# Altium footprint library Power_PCB.PcbLib: 52 footprints (part 3 of 4)
Each footprint in its own frame and in the unit in brackets; x right, y up, seen from the top. Pads: shape width x height; smd on the part's side, far side on the other; paste and mask are expansions set on the pad; w line width, h text height; cw(c..) or ccw(c..) is an arc to the next point about the centre after c.
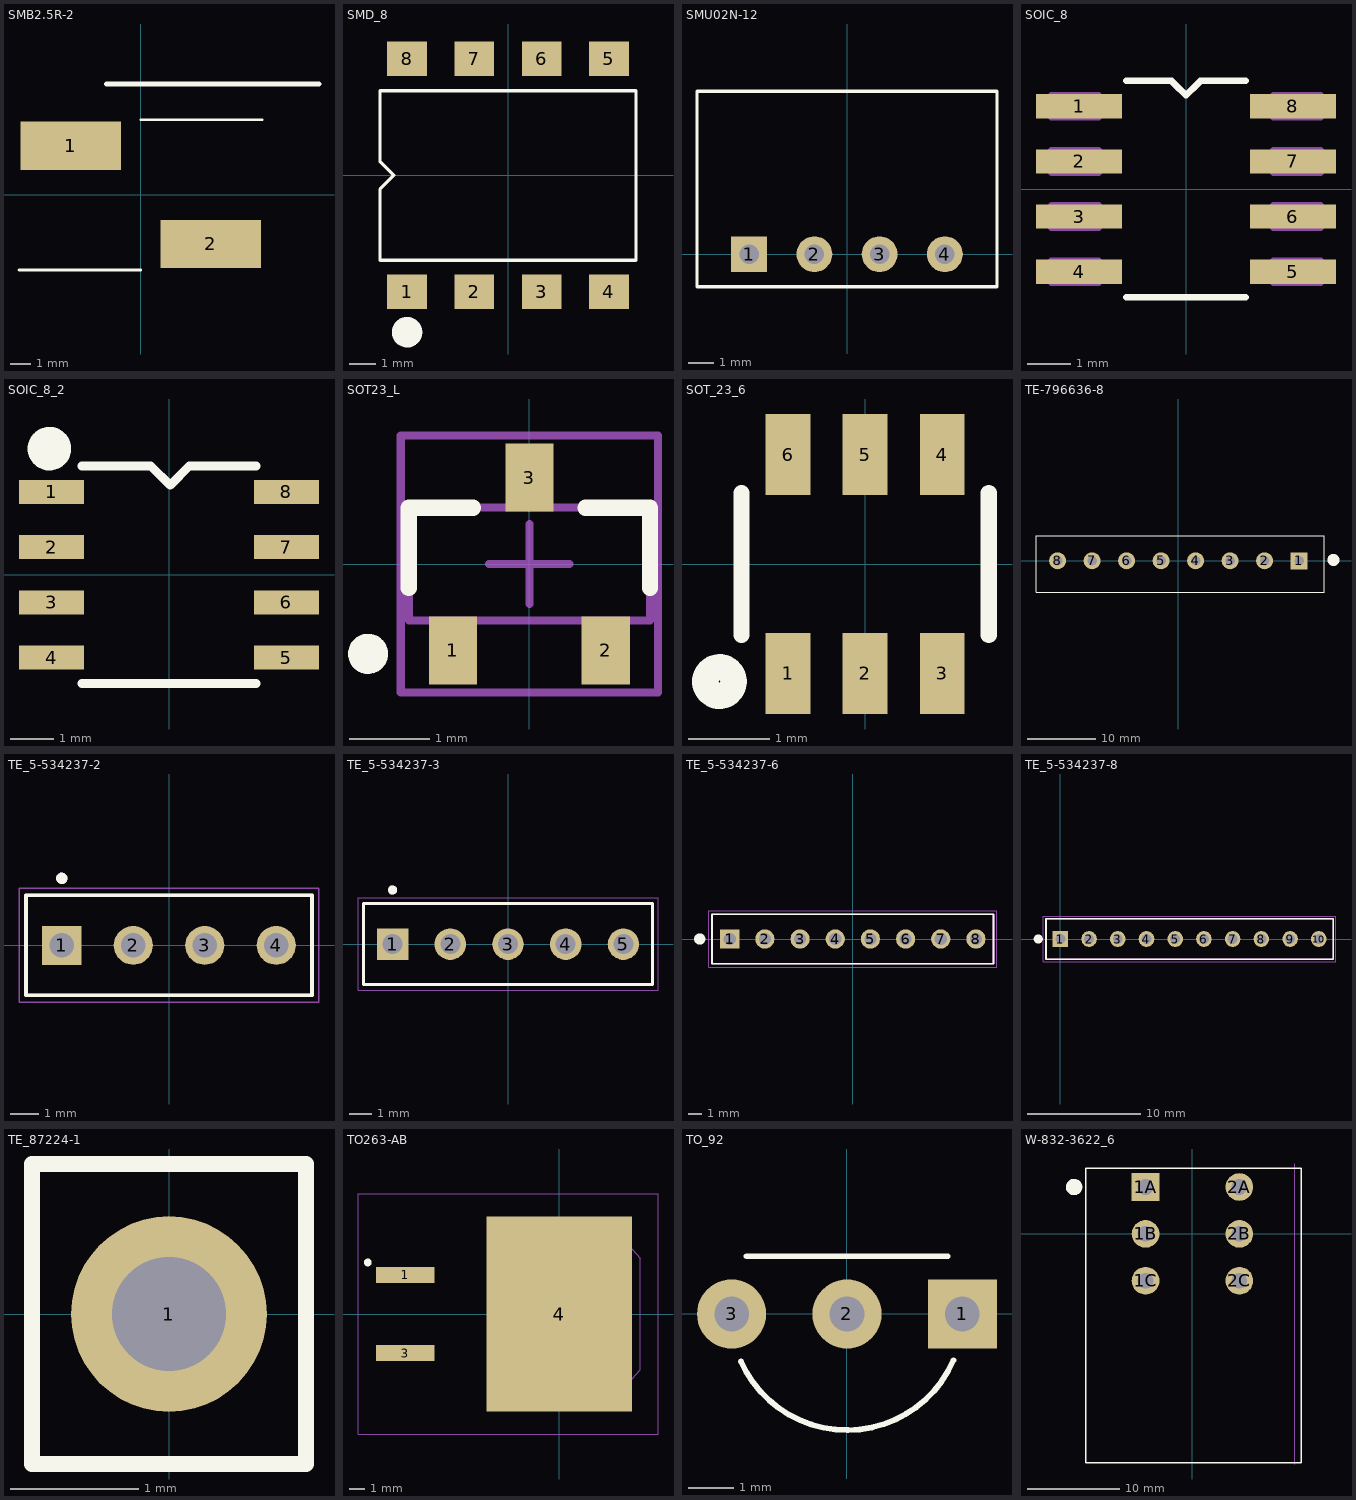
[diagram p2: the footprints below, top view; thin cyan lines are the x and y axes]

## SMB2.5R-2 [mm]
height 0.508
pads (2):
  rect 4.8x2.3 smd: 1(-3.35,2.35) 2(3.35,-2.35)
Top Overlay:
  lines w0.127: -5.825,-3.6 0,-3.6 ; 0,3.6 5.825,3.6
  lines w0.254: -1.626,5.309 8.534,5.309
3D body: height 4.7, standoff 0, extent -5.825,-3.6 5.825,3.6

## SMD_8 [mm]
pads (8):
  rect 1.5x1.3 smd: 1(-3.81,-4.4) 2(-1.27,-4.4) 3(1.27,-4.4) 4(3.81,-4.4) 5(3.81,4.4) 6(1.27,4.4) 7(-1.27,4.4) 8(-3.81,4.4)
Top Overlay:
  circle w0.635: c-3.81,-5.918 r0.257
  lines w0.127: -4.83,-3.2 -4.83,-0.512 -4.318,0 -4.83,0.512 -4.83,3.2 4.83,3.2 4.83,-3.2 -4.83,-3.2
3D body "G3VM_61FR1.step": height 4, standoff 0, extent -4.83,-5.006 4.83,4.994

## SMU02N-12 [mil]
pads (4):
  rect 55x55 hole 30: 1(-150,0)
  round 55 hole 30: 2(-50,0) 3(50,0) 4(150,0)
Top Overlay:
  lines w5: -230,-50 230,-50 230,250 -230,250 -230,-50
3D body: height 400, standoff 0, extent -230,-50 230,250

## SOIC_8 [mil]
pads (8):
  rect 78x22 smd: 1(-97,75) 2(-97,25) 3(-97,-25) 4(-97,-75) 5(97,-75) 6(97,-25) 7(97,25) 8(97,75)
Top Overlay:
  lines w0: -12,98 ccw(c0,98) 12,98
  lines w6: -54,-98 54,-98 ; -54,98 -13,98 0,85 13,98 54,98
Mechanical 4:
  lines w0: -12,98 ccw(c0,98) 12,98 cw(c0,98) -12,98
  lines w6: -122,-85 -79,-85 ; -122,-85 -122,-65 ; -122,-85 -79,-85 ; -122,-85 -122,-65 ; -122,-65 -79,-65 ; -122,-65 -79,-65 ; -122,-35 -79,-35 ; -122,-35 -122,-15 ; -122,-35 -79,-35 ; -122,-35 -122,-15 ; -122,-15 -79,-15 ; -122,-15 -79,-15 ; -122,15 -79,15 ; -122,15 -122,35 ; -122,15 -79,15 ; -122,15 -122,35 ; -122,35 -79,35 ; -122,35 -79,35 ; -122,65 -79,65 ; -122,65 -122,85 ; -122,65 -79,65 ; -122,65 -122,85 ; -122,85 -79,85 ; -122,85 -79,85 ; -79,-85 -79,-65 ; -79,-85 -79,-65 ; -79,-35 -79,-15 ; -79,-35 -79,-15 ; -79,15 -79,35 ; -79,15 -79,35 ; -79,65 -79,85 ; -79,65 -79,85 ; 79,-85 122,-85 ; 79,-85 79,-65 ; 79,-85 122,-85 ; 79,-85 79,-65 ; 79,-65 122,-65 ; 79,-65 122,-65 ; 79,-35 122,-35 ; 79,-35 79,-15 ; 79,-35 122,-35 ; 79,-35 79,-15 ; 79,-15 122,-15 ; 79,-15 122,-15 ; 79,15 122,15 ; 79,15 79,35 ; 79,15 122,15 ; 79,15 79,35 ; 79,35 122,35 ; 79,35 122,35 ; 79,65 122,65 ; 79,65 79,85 ; 79,65 122,65 ; 79,65 79,85 ; 79,85 122,85 ; 79,85 122,85 ; 122,-85 122,-65 ; 122,-85 122,-65 ; 122,-35 122,-15 ; 122,-35 122,-15 ; 122,15 122,35 ; 122,15 122,35 ; 122,65 122,85 ; 122,65 122,85
3D body "ADUM5242ARZ-RL7.STEP": height 69.53, standoff 0.63, extent -118.1,-96.47 118.12,96.45

## SOIC_8_2 [mm]
pads (8):
  rect 1.5x0.55 smd: 1(-2.7,1.905) 2(-2.7,0.635) 3(-2.7,-0.635) 4(-2.7,-1.905) 5(2.7,-1.905) 6(2.7,-0.635) 7(2.7,0.635) 8(2.7,1.905)
Top Overlay:
  circle w0.5: c-2.75,2.9 r0.25
  lines w0.2: -2,-2.5 2,-2.5 ; -2,2.5 -0.417,2.5 0.025,2.057 0.468,2.5 2,2.5
3D body: height 1.75, standoff 0.25, extent -2,-2.5 2,2.5

## SOT23_L [mm] "SOT23, 3-Leads, Body 2.9x1.3mm, Pitch 0.95mm, Lead Span 2.3mm - Reverse Pinning, IPC High Density"
height 1.1
pads (3):
  rect 0.6x0.85 smd: 1(-0.95,-1.075) 2(0.95,-1.075) 3(0,1.075)
Top Overlay:
  circle w0.25: c-2.007,-1.118 r0.125
  lines w0.2: -1.5,-0.3 -1.5,0.7 -0.7,0.7 ; 0.7,0.7 1.5,0.7 1.5,-0.3
Mechanical 13:
  lines w0.1: -1.5,-0.7 1.5,-0.7 1.5,0.7 -1.5,0.7 -1.5,-0.7
Mechanical 15:
  lines w0.1: -0.5,0 0.5,0 ; 0,-0.5 0,0.5 ; -1.6,-1.6 1.6,-1.6 1.6,1.6 -1.6,1.6 -1.6,-1.6
3D body: height 1.1, standoff 0, extent -1.5,-0.7 1.5,0.7

## SOT_23_6 [mm]
height 0.508
pads (6):
  rect 0.55x1 smd: 1(-0.95,-1.35) 2(0,-1.35) 3(0.95,-1.35) 4(0.95,1.35) 5(0,1.35) 6(-0.95,1.35)
Top Overlay:
  circle w0.325: c-1.795,-1.45 r0.175
  lines w0.2: -1.525,-0.875 -1.525,0.877 ; 1.525,-0.875 1.525,0.875
3D body: height 1.45, standoff 0, extent -1.53,-0.88 1.53,0.88

## TE-796636-8 [mm] "TERM BLOCK HDR 8POS VERT 5.08MM"
pads (8):
  rect 2.5x2.5 hole 1.397 mask+0: 1(17.78,0)
  round 2.5 hole 1.397 mask+0: 2(12.7,0) 3(7.62,0) 4(2.54,0) 5(-2.54,0) 6(-7.62,0) 7(-12.7,0) 8(-17.78,0)
Top Overlay:
  circle w1.016: c22.835,0.127 r0.381
  lines w0.127: -20.955,-4.623 21.463,-4.623 21.463,3.683 -20.955,3.683 -20.955,-4.623
3D body: height 0.25, standoff 0, extent -17.78,0 -17.526,0.254
3D body "c-796636-8-b-3d.stp": height 12.06, standoff -3.43, extent -20.976,-4.667 21.484,3.683

## TE_5-534237-2 [mm]
pads (4):
  rect 1.388x1.388 hole 0.88: 1(-3.81,0)
  round 1.388 hole 0.88: 2(-1.27,0) 3(1.27,0) 4(3.81,0)
Top Overlay:
  circle w0.2: c-3.81,2.38 r0.1
  lines w0.127: -5.08,-1.78 -5.08,1.78 5.08,1.78 5.08,-1.78 -5.08,-1.78
Mechanical 13:
  circle w0.2: c-3.81,2.38 r0.1
  lines w0.127: -5.08,-1.78 -5.08,1.78 5.08,1.78 5.08,-1.78 -5.08,-1.78
Mechanical 15:
  lines w0.05: -5.33,-2.03 -5.33,2.03 5.33,2.03 5.33,-2.03 -5.33,-2.03
3D body "5-534237-2--3DModel-STEP-1.STEP": height 8.7, standoff -2.86, extent -5.105,-1.778 5.055,1.778

## TE_5-534237-3 [mm]
pads (5):
  rect 1.388x1.388 hole 0.88: 1(-5.08,0)
  round 1.388 hole 0.88: 2(-2.54,0) 3(0,0) 4(2.54,0) 5(5.08,0)
Top Overlay:
  circle w0.2: c-5.08,2.38 r0.1
  lines w0.127: -6.35,-1.78 6.35,-1.78 6.35,1.78 -6.35,1.78 -6.35,-1.78
Mechanical 13:
  circle w0.2: c-5.08,2.38 r0.1
  lines w0.127: -6.35,-1.78 6.35,-1.78 6.35,1.78 -6.35,1.78 -6.35,-1.78
Mechanical 15:
  lines w0.05: -6.6,-2.03 6.6,-2.03 6.6,2.03 -6.6,2.03 -6.6,-2.03
3D body "5-534237-3--3DModel-STEP-1.STEP": height 8.7, standoff -2.86, extent -6.35,-1.778 6.35,1.778

## TE_5-534237-6 [mm]
pads (8):
  rect 1.388x1.388 hole 0.88: 1(-8.89,0)
  round 1.388 hole 0.88: 2(-6.35,0) 3(-3.81,0) 4(-1.27,0) 5(1.27,0) 6(3.81,0) 7(6.35,0) 8(8.89,0)
Top Overlay:
  circle w0.4: c-11.05,0 r0.2
  lines w0.127: -10.16,-1.78 10.16,-1.78 10.16,1.78 -10.16,1.78 -10.16,-1.78
Mechanical 13:
  circle w0.4: c-8.89,0 r0.2
  lines w0.127: -10.16,-1.78 10.16,-1.78 10.16,1.78 -10.16,1.78 -10.16,-1.78
Mechanical 15:
  lines w0.05: -10.41,-2.03 -10.41,2.03 10.41,2.03 10.41,-2.03 -10.41,-2.03
3D body "5-534237-6--3DModel-STEP-1.STEP": height 8.7, standoff -2.86, extent -10.16,-1.803 10.16,1.753

## TE_5-534237-8 [mm]
pads (10):
  rect 1.388x1.388 hole 0.88: 1(0,0)
  round 1.388 hole 0.88: 2(2.54,0) 3(5.08,0) 4(7.62,0) 5(10.16,0) 6(12.7,0) 7(15.24,0) 8(17.78,0) 9(20.32,0) 10(22.86,0)
Top Overlay:
  circle w0.4: c-1.951,0 r0.2
  lines w0.152: -1.27,-1.78 24.13,-1.78 24.13,1.78 -1.27,1.78 -1.27,-1.78
Mechanical 13:
  lines w0.152: -1.27,-1.78 24.13,-1.78 24.13,1.78 -1.27,1.78 -1.27,-1.78
Mechanical 15:
  lines w0.05: -1.52,-2.03 24.38,-2.03 24.38,2.03 -1.52,2.03 -1.52,-2.03
3D body "5-534237-8--3DModel-STEP-1.STEP": height 8.7, standoff -2.86, extent -1.27,-1.702 24.13,1.854

## TE_87224-1 [mil]
pads (1):
  round 60 hole 35: 1(0,0)
Top Overlay:
  lines w5: -42,-46 42,-46 42,46 -42,46 -42,-46
3D body "c-87224-1-l-3d.stp": height 408.55, standoff -124.45, extent -42,-46 42,46

## TO263-AB [mm]
height 4.4
pads (3):
  rect 3.8x1.05 smd: 1(-10,2.54) 3(-10,-2.54)
  rect 9.45x12.7 smd: 4(0,0)
Top Overlay:
  circle w0.25: c-12.446,3.353 r0.125
Top Paste:
  region: -1.14,-4.01 0.38,-4.01 0.38,-2.47 -1.14,-2.47
  region: 1.14,-4.01 2.66,-4.01 2.66,-2.47 1.14,-2.47
  region: -1.14,-1.85 0.38,-1.85 0.38,-0.31 -1.14,-0.31
  region: 1.14,-1.85 2.66,-1.85 2.66,-0.31 1.14,-0.31
  region: -1.14,0.31 0.38,0.31 0.38,1.85 -1.14,1.85
  region: 1.14,0.31 2.66,0.31 2.66,1.85 1.14,1.85
  region: -1.14,2.47 0.38,2.47 0.38,4.01 -1.14,4.01
  region: 1.14,2.47 2.66,2.47 2.66,4.01 1.14,4.01
Mechanical 7:
  text ".Designator" at -0.8,-0.4 h1.3
Mechanical 9:
  lines w0: 4.105,-4.508 4.491,-4.508 5.275,-3.639 5.275,3.638 4.491,4.507 4.105,4.507 ; -3.895,-4.698 4.105,-4.698 4.105,4.698 -3.895,4.698 -3.895,-4.698
Mechanical 13:
  lines w0.05: -3.96,-4.76 4.17,-4.76 4.17,4.76 -3.96,4.76 -3.96,-4.76
Mechanical 15:
  lines w0.05: -0.5,0 0.5,0 ; 0,-0.5 0,0.5 ; -13.081,-7.823 6.426,-7.823 6.426,7.823 -13.081,7.823 -13.081,-7.823
3D body: height 4.4, standoff 0, extent -3.959,-4.759 4.169,4.759

## TO_92 [mil]
pads (3):
  rect 60x60 hole 30: 1(100,0)
  round 60 hole 30: 2(0,0) 3(-100,0)
Top Overlay:
  lines w5: -91.89,-41.06 ccw(c0,0) 92.35,-40.02 ; -87.05,50 87.25,50

## W-832-3622_6 [mm]
pads (6):
  rect 3x3 hole 1.702 mask+0: 1A(-5.08,5.08)
  round 3 hole 1.702 mask+0: 1B(-5.08,0) 1C(-5.08,-5.08) 2A(5.08,5.08) 2B(5.08,0) 2C(5.08,-5.08)
Top Overlay:
  circle w1.016: c-12.827,5.08 r0.381
  lines w0.152: -11.557,-24.811 11.811,-24.811 11.811,7.112 -11.557,7.112 -11.557,-24.811
Mechanical 15:
  lines w0: 11.062,-24.938 11.062,7.574
3D body: height 0.25, standoff 0, extent -5.08,5.08 -4.826,5.334
3D body "832-3622.stp": height 16.5, standoff -4, extent -11.603,-24.888 11.857,7.112